# Altium footprint library SIM Modules.PcbLib: 8 footprints
Each footprint in its own frame and in the unit in brackets; x right, y up, seen from the top. Pads: shape width x height; smd on the part's side, far side on the other; paste and mask are expansions set on the pad; w line width, h text height; cw(c..) or ccw(c..) is an arc to the next point about the centre after c.
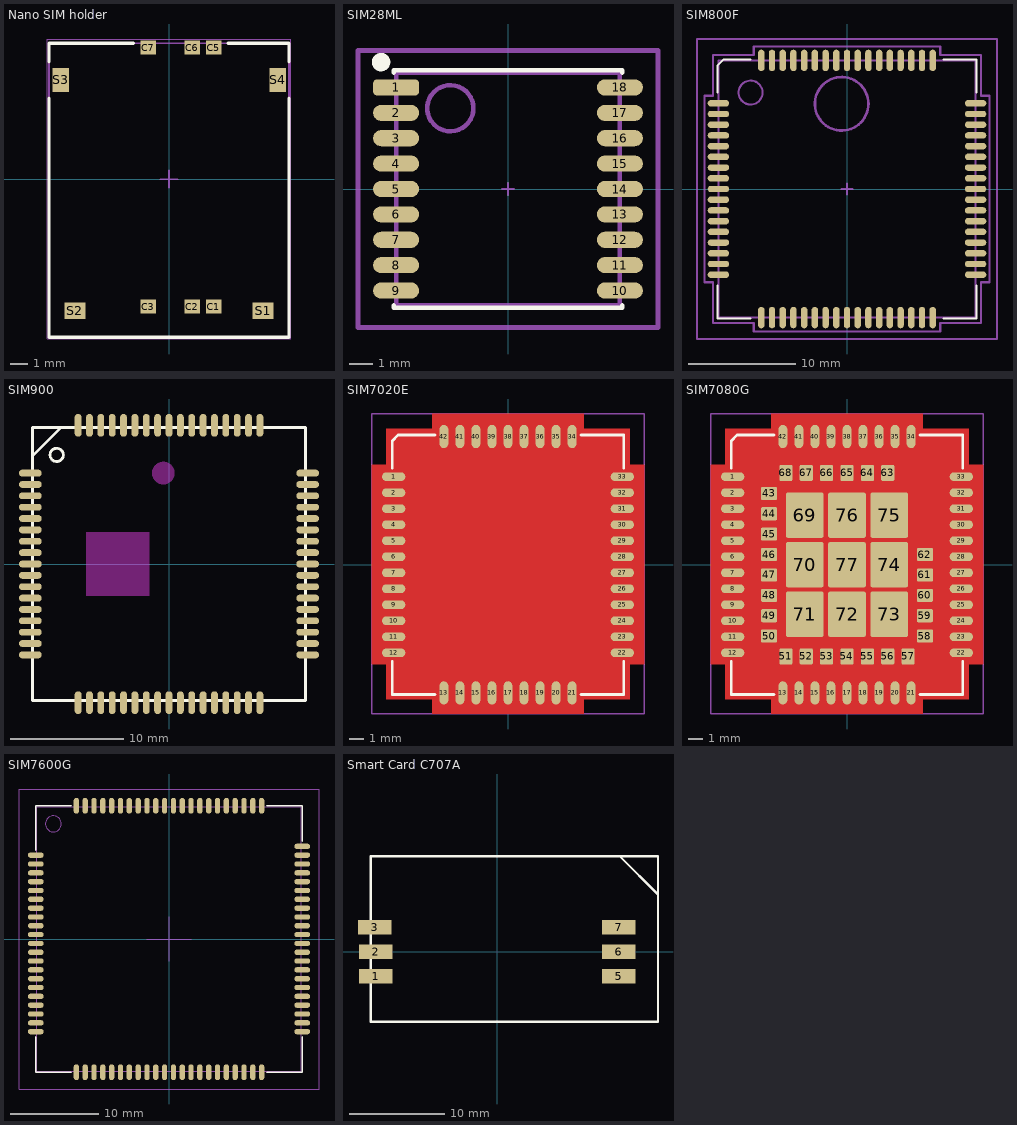
[diagram p0: the footprints below, top view; thin cyan lines are the x and y axes]

## Nano SIM holder [mm] "78800-0001"
pads (10):
  rect 0.9x0.8 smd: C1(2.57,-7.355) C2(1.33,-7.355) C3(-1.21,-7.355) C5(2.57,7.585) C6(1.33,7.585) C7(-1.21,7.585)
  rect 1.2x0.95 smd: S1(5.42,-7.585) S2(-5.43,-7.585)
  rect 0.95x1.4 smd: S3(-6.26,5.725) S4(6.26,5.725)
Top Overlay:
  lines w0.2: -6.93,4.676 -6.93,-9.125 6.92,-9.125 6.92,4.67 ; -6.93,6.774 -6.93,7.835 -2.06,7.835 ; 3.42,7.835 6.92,7.835 6.92,6.78
Mechanical 13:
  lines w0.1: -6.93,-9.125 6.92,-9.125 6.92,7.835 -6.93,7.835 -6.93,-9.125
Mechanical 15:
  lines w0.05: -7.03,-9.225 -7.03,8.085 7.02,8.085 7.02,-9.225 -7.03,-9.225
  lines w0.1: -0.5,0 0.5,0 ; 0,-0.5 0,0.5
3D body: height 1.51, standoff 0.01, extent -6.93,-9.125 6.92,7.835

## SIM28ML [mm]
pads (18):
  rrect50% 2x0.7 smd: 1(-4.85,4.4)
  oval 2x0.7 smd: 2(-4.85,3.3) 3(-4.85,2.2) 4(-4.85,1.1) 5(-4.85,0) 6(-4.85,-1.1) 7(-4.85,-2.2) 8(-4.85,-3.3) 9(-4.85,-4.4) 10(4.85,-4.4) 11(4.85,-3.3) 12(4.85,-2.2) 13(4.85,-1.1) 14(4.85,0) 15(4.85,1.1) 16(4.85,2.2) 17(4.85,3.3) 18(4.85,4.4)
Top Overlay:
  circle w0.4: c-5.5,5.5 r0.2
  lines w0.2: -4.95,-5.05 -4.95,-5.15 4.95,-5.15 4.95,-5.05 ; -4.95,5.05 -4.95,5.15 4.95,5.15 4.95,5.05
Mechanical 13:
  circle w0.2: c-2.5,3.5 r1
  lines w0.2: -4.85,-5.05 4.85,-5.05 4.85,5.05 -4.85,5.05 -4.85,-5.05
Mechanical 15:
  lines w0.1: -0.25,0 0.25,0 ; 0,-0.25 0,0.25
  lines w0.2: -6.5,-6 -6.5,6 6.5,6 6.5,-6 -6.5,-6
3D body: height 2.56, standoff -0.01, extent -4.86,-5.05 4.86,5.05

## SIM800F [mm]
pads (68):
  oval 2x0.6 smd: 1(-12,8) 2(-12,7) 3(-12,6) 4(-12,5) 5(-12,4) 6(-12,3) 7(-12,2) 8(-12,1) 9(-12,0) 10(-12,-1) 11(-12,-2) 12(-12,-3) 13(-12,-4) 14(-12,-5) 15(-12,-6) 16(-12,-7) 17(-12,-8) 35(12,-8) 36(12,-7) 37(12,-6) 38(12,-5) 39(12,-4) 40(12,-3) 41(12,-2) 42(12,-1) 43(12,0) 44(12,1) 45(12,2) 46(12,3) 47(12,4) 48(12,5) 49(12,6) 50(12,7) 51(12,8)
  oval 0.6x2 smd: 18(-8,-12) 19(-7,-12) 20(-6,-12) 21(-5,-12) 22(-4,-12) 23(-3,-12) 24(-2,-12) 25(-1,-12) 26(0,-12) 27(1,-12) 28(2,-12) 29(3,-12) 30(4,-12) 31(5,-12) 32(6,-12) 33(7,-12) 34(8,-12) 52(8,12) 53(7,12) 54(6,12) 55(5,12) 56(4,12) 57(3,12) 58(2,12) 59(1,12) 60(0,12) 61(-1,12) 62(-2,12) 63(-3,12) 64(-4,12) 65(-5,12) 66(-6,12) 67(-7,12) 68(-8,12)
Top Overlay:
  lines w0.2: -12.1,-9 -12.1,-12.1 -9,-12.1 ; -12.1,9 -12.1,11.5 -11.5,12.1 -9,12.1 ; 9,-12.1 12.1,-12.1 12.1,-9 ; 9,12.1 12.1,12.1 12.1,9
Mechanical 13:
  circle w0.2: c-9,9 r1.118
  circle w0.254: c-0.5,7.95 r2.5
  lines w0.2: -13.3,-8.7 -13.3,8.7 -12.5,8.7 -12.5,12.5 -8.7,12.5 -8.7,13.3 8.7,13.3 8.7,12.5 12.5,12.5 12.5,8.7 13.3,8.7 13.3,-8.7 12.5,-8.7 12.5,-12.5 8.7,-12.5 8.7,-13.3 0,-13.3 -8.7,-13.3 -8.7,-12.5 -12.5,-12.5 -12.5,-8.7 -13.3,-8.7 ; -12,-12 -12,12 12,12 12,-12 -12,-12
  text "Keep-out area A" at 1.6,-13.9 h0.4
  text "Via keepout" at -2.5,7.8 h0.4
Mechanical 15:
  lines w0.2: -0.5,0 0.5,0 ; 0,-0.5 0,0 0,0.5 ; -14,-14 -14,14 14,14 14,-14 -14,-14
3D body: height 4.13, standoff 0, extent -12,-12 12,12

## SIM900 [mm]
pads (68):
  oval 2x0.6 smd: 1(-12.2,8) 2(-12.2,7) 3(-12.2,6) 4(-12.2,5) 5(-12.2,4) 6(-12.2,3) 7(-12.2,2) 8(-12.2,1) 9(-12.2,0) 10(-12.2,-1) 11(-12.2,-2) 12(-12.2,-3) 13(-12.2,-4) 14(-12.2,-5) 15(-12.2,-6) 16(-12.2,-7) 17(-12.2,-8) 35(12.2,-8) 36(12.2,-7) 37(12.2,-6) 38(12.2,-5) 39(12.2,-4) 40(12.2,-3) 41(12.2,-2) 42(12.2,-1) 43(12.2,0) 44(12.2,1) 45(12.2,2) 46(12.2,3) 47(12.2,4) 48(12.2,5) 49(12.2,6) 50(12.2,7) 51(12.2,8)
  oval 0.6x2 smd: 18(-8,-12.2) 19(-7,-12.2) 20(-6,-12.2) 21(-5,-12.2) 22(-4,-12.2) 23(-3,-12.2) 24(-2,-12.2) 25(-1,-12.2) 26(0,-12.2) 27(1,-12.2) 28(2,-12.2) 29(3,-12.2) 30(4,-12.2) 31(5,-12.2) 32(6,-12.2) 33(7,-12.2) 34(8,-12.2) 52(8,12.2) 53(7,12.2) 54(6,12.2) 55(5,12.2) 56(4,12.2) 57(3,12.2) 58(2,12.2) 59(1,12.2) 60(0,12.2) 61(-1,12.2) 62(-2,12.2) 63(-3,12.2) 64(-4,12.2) 65(-5,12.2) 66(-6,12.2) 67(-7,12.2) 68(-8,12.2)
Top Overlay:
  circle w0.254: c-9.883,9.6 r0.583
  lines w0.254: -12,9.5 -9.5,12 ; -12,-12 -12,12 12,12 12,-12 -12,-12
Keep-Out Layer:
  circle w1: c-0.5,8 r0.5
  rectangle: -7.3,-2.8 -1.7,2.8
3D body: height 3, standoff 0, extent -12,-12 12,12

## SIM7020E [mm]
height 2.4
pads (42):
  oval 1.6x0.6 smd: 1(-7.85,6.05) 2(-7.85,4.95) 3(-7.85,3.85) 4(-7.85,2.75) 5(-7.85,1.65) 6(-7.85,0.55) 7(-7.85,-0.55) 8(-7.85,-1.65) 9(-7.85,-2.75) 10(-7.85,-3.85) 11(-7.85,-4.95) 12(-7.85,-6.05) 22(7.85,-6.05) 23(7.85,-4.95) 24(7.85,-3.85) 25(7.85,-2.75) 26(7.85,-1.65) 27(7.85,-0.55) 28(7.85,0.55) 29(7.85,1.65) 30(7.85,2.75) 31(7.85,3.85) 32(7.85,4.95) 33(7.85,6.05)
  oval 0.6x1.6 smd: 13(-4.4,-8.8) 14(-3.3,-8.8) 15(-2.2,-8.8) 16(-1.1,-8.8) 17(0,-8.8) 18(1.1,-8.8) 19(2.2,-8.8) 20(3.3,-8.8) 21(4.4,-8.8) 34(4.4,8.8) 35(3.3,8.8) 36(2.2,8.8) 37(1.1,8.8) 38(0,8.8) 39(-1.1,8.8) 40(-2.2,8.8) 41(-3.3,8.8) 42(-4.4,8.8)
Top Layer:
  pour cut-out: -5.2,-9.25 -5.2,-10.25 5.2,-10.25 5.2,-9.25 8.35,-9.25 8.35,-6.85 9.35,-6.85 9.35,6.85 8.35,6.85 8.35,9.35 5.2,9.35 5.2,10.35 -5.2,10.35 -5.2,9.35 -8.35,9.35 -8.35,6.85 -9.35,6.85 -9.35,-6.85 -8.35,-6.85 -8.35,-9.25
Top Overlay:
  lines w0.2: -7.95,-6.65 -7.95,-8.9 -5,-8.9 ; -7.95,6.65 -7.95,8.5 -7.55,8.9 -5,8.9 ; 5,-8.9 7.95,-8.9 7.95,-6.65 ; 5,8.9 7.95,8.9 7.95,6.65
Mechanical 13:
  circle w0.1: c-6.75,7.75 r0.427
  lines w0.1: -7.85,8.6 -7.65,8.8 7.85,8.8 7.85,-8.8 -7.85,-8.8 -7.85,8.6 ; -7.85,8.6 -7.85,8.6
Mechanical 15:
  lines w0.1: -0.5,0 0.5,0 ; 0,-0.5 0,0.5 ; -9.35,-10.25 9.35,-10.25 9.35,10.35 -9.35,10.35 -9.35,-10.25
3D body: height 2.3, standoff 0, extent -7.85,-8.8 7.85,8.8

## SIM7080G [mm]
height 2.4
pads (77):
  oval 1.6x0.6 smd: 1(-7.85,6.05) 2(-7.85,4.95) 3(-7.85,3.85) 4(-7.85,2.75) 5(-7.85,1.65) 6(-7.85,0.55) 7(-7.85,-0.55) 8(-7.85,-1.65) 9(-7.85,-2.75) 10(-7.85,-3.85) 11(-7.85,-4.95) 12(-7.85,-6.05) 22(7.85,-6.05) 23(7.85,-4.95) 24(7.85,-3.85) 25(7.85,-2.75) 26(7.85,-1.65) 27(7.85,-0.55) 28(7.85,0.55) 29(7.85,1.65) 30(7.85,2.75) 31(7.85,3.85) 32(7.85,4.95) 33(7.85,6.05)
  oval 0.6x1.6 smd: 13(-4.4,-8.8) 14(-3.3,-8.8) 15(-2.2,-8.8) 16(-1.1,-8.8) 17(0,-8.8) 18(1.1,-8.8) 19(2.2,-8.8) 20(3.3,-8.8) 21(4.4,-8.8) 34(4.4,8.8) 35(3.3,8.8) 36(2.2,8.8) 37(1.1,8.8) 38(0,8.8) 39(-1.1,8.8) 40(-2.2,8.8) 41(-3.3,8.8) 42(-4.4,8.8)
  rrect20% 1.1x0.9 smd: 43(-5.35,4.9) 44(-5.35,3.5) 45(-5.35,2.1) 46(-5.35,0.7) 47(-5.35,-0.7) 48(-5.35,-2.1) 49(-5.35,-3.5) 50(-5.35,-4.9) 58(5.35,-4.9) 59(5.35,-3.5) 60(5.35,-2.1) 61(5.35,-0.7) 62(5.35,0.7)
  rrect20% 0.9x1.1 smd: 51(-4.2,-6.3) 52(-2.8,-6.3) 53(-1.4,-6.3) 54(0,-6.3) 55(1.4,-6.3) 56(2.8,-6.3) 57(4.2,-6.3) 63(2.8,6.3) 64(1.4,6.3) 65(0,6.3) 66(-1.4,6.3) 67(-2.8,6.3) 68(-4.2,6.3)
  rrect10% 2.6x3.1 smd paste-0.2: 69(-2.9,3.4) 70(-2.9,0) 71(-2.9,-3.4) 72(0,-3.4) 73(2.9,-3.4) 74(2.9,0) 75(2.9,3.4) 76(0,3.4) 77(0,0)
Top Layer:
  pour cut-out: -5.2,-9.25 -5.2,-10.25 5.2,-10.25 5.2,-9.25 8.35,-9.25 8.35,-6.85 9.35,-6.85 9.35,6.85 8.35,6.85 8.35,9.35 5.2,9.35 5.2,10.35 -5.2,10.35 -5.2,9.35 -8.35,9.35 -8.35,6.85 -9.35,6.85 -9.35,-6.85 -8.35,-6.85 -8.35,-9.25
Top Overlay:
  lines w0.2: -7.95,-6.65 -7.95,-8.9 -5,-8.9 ; -7.95,6.65 -7.95,8.5 -7.55,8.9 -5,8.9 ; 5,-8.9 7.95,-8.9 7.95,-6.65 ; 5,8.9 7.95,8.9 7.95,6.65
Mechanical 13:
  circle w0.1: c-6.75,7.75 r0.427
  lines w0.1: -7.85,8.6 -7.65,8.8 7.85,8.8 7.85,-8.8 -7.85,-8.8 -7.85,8.6 ; -7.85,8.6 -7.85,8.6
Mechanical 15:
  lines w0.1: -0.5,0 0.5,0 ; 0,-0.5 0,0.5 ; -9.35,-10.25 9.35,-10.25 9.35,10.35 -9.35,10.35 -9.35,-10.25
3D body: height 2.3, standoff 0, extent -7.85,-8.8 7.85,8.8

## SIM7600G [mm] "SIM7600G LTE CAT 1 modem"
height 2.9
pads (87):
  oval 1.8x0.6 smd: 1(-15.1,9.5) 2(-15.1,8.5) 3(-15.1,7.5) 4(-15.1,6.5) 5(-15.1,5.5) 6(-15.1,4.5) 7(-15.1,3.5) 8(-15.1,2.5) 9(-15.1,1.5) 10(-15.1,0.5) 11(-15.1,-0.5) 12(-15.1,-1.5) 13(-15.1,-2.5) 14(-15.1,-3.5) 15(-15.1,-4.5) 16(-15.1,-5.5) 17(-15.1,-6.5) 18(-15.1,-7.5) 19(-15.1,-8.5) 20(-15.1,-9.5) 21(-15.1,-10.5) 44(15.1,-10.5) 45(15.1,-9.5) 46(15.1,-8.5) 47(15.1,-7.5) 48(15.1,-6.5) 49(15.1,-5.5) 50(15.1,-4.5) 51(15.1,-3.5) 52(15.1,-2.5) 53(15.1,-1.5) 54(15.1,-0.5) 55(15.1,0.5) 56(15.1,1.5) 57(15.1,2.5) 58(15.1,3.5) 59(15.1,4.5) 60(15.1,5.5) 61(15.1,6.5) 62(15.1,7.5) 63(15.1,8.5) 64(15.1,9.5) 65(15.1,10.5)
  oval 0.6x1.8 smd: 22(-10.5,-15.1) 23(-9.5,-15.1) 24(-8.5,-15.1) 25(-7.5,-15.1) 26(-6.5,-15.1) 27(-5.5,-15.1) 28(-4.5,-15.1) 29(-3.5,-15.1) 30(-2.5,-15.1) 31(-1.5,-15.1) 32(-0.5,-15.1) 33(0.5,-15.1) 34(1.5,-15.1) 35(2.5,-15.1) 36(3.5,-15.1) 37(4.5,-15.1) 38(5.5,-15.1) 39(6.5,-15.1) 40(7.5,-15.1) 41(8.5,-15.1) 42(9.5,-15.1) 43(10.5,-15.1) 66(10.5,15.1) 67(9.5,15.1) 68(8.5,15.1) 69(7.5,15.1) 70(6.5,15.1) 71(5.5,15.1) 72(4.5,15.1) 73(3.5,15.1) 74(2.5,15.1) 75(1.5,15.1) 76(0.5,15.1) 77(-0.5,15.1) 78(-1.5,15.1) 79(-2.5,15.1) 80(-3.5,15.1) 81(-4.5,15.1) 82(-5.5,15.1) 83(-6.5,15.1) 84(-7.5,15.1) 85(-8.5,15.1) 86(-9.5,15.1) 87(-10.5,15.1)
Top Overlay:
  lines w0.2: -15.1,-11.1 -15.1,-15.1 -11.1,-15.1 ; -15.1,10.1 -15.1,15.1 -11.1,15.1 ; 11.1,-15.1 15.1,-15.1 15.1,-11.1 ; 11.1,15.1 15.1,15.1 15.1,11.1
Mechanical 13:
  circle w0.1: c-13.1,13.05 r0.91
  lines w0.1: -15,-15 -15,15 15,15 15,-15 -15,-15
Mechanical 15:
  lines w0.1: -2.5,0 2.5,0 ; 0,-2.5 0,2.5 ; -17,-17 -17,17 17,17 17,-17 -17,-17
3D body: height 2.9, standoff 0, extent -15,-15 15,15

## Smart Card C707A [mm] "Amphenol C707 10M006 049 2"
pads (6):
  rect 3.5x1.5 smd: 1(-12.7,-2.56) 2(-12.7,0) 3(-12.8,2.56) 5(12.7,-2.56) 6(12.7,0) 7(12.7,2.56)
Top Overlay:
  lines w0.254: 12.5,10 12.8,10 16.8,6 ; -13.2,-7.3 16.8,-7.3 16.8,10 -13.2,10 -13.2,-7.3
3D body: height 2.5, standoff 0, extent -13.2,-7.35 16.8,9.95